# Altium footprint library 2.52-直插元件.PcbLib: 165 footprints (part 7 of 11)
Each footprint in its own frame and in the unit in brackets; x right, y up, seen from the top. Pads: shape width x height; smd on the part's side, far side on the other; paste and mask are expansions set on the pad; w line width, h text height; cw(c..) or ccw(c..) is an arc to the next point about the centre after c.
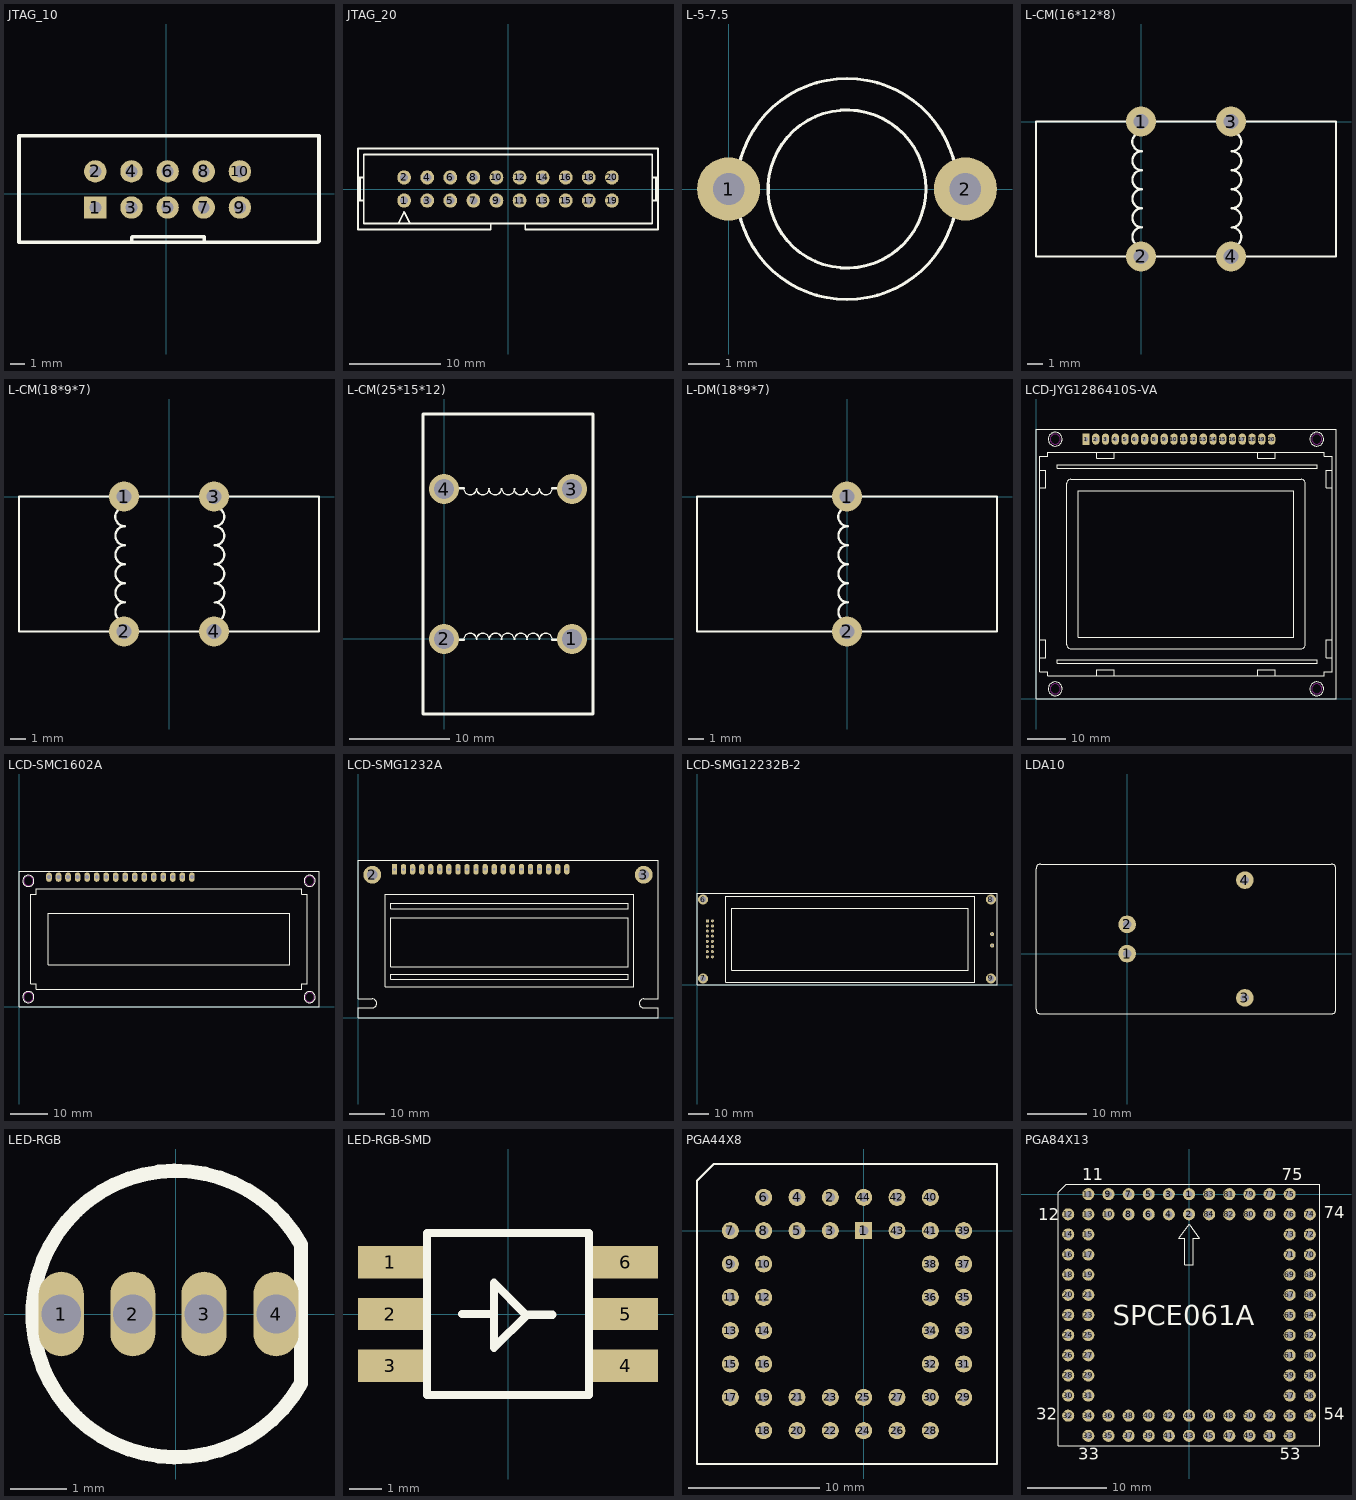
[diagram p6: the footprints below, top view; thin cyan lines are the x and y axes]

## JTAG_10 [mil]
pads (10):
  rect 62x62 hole 33: 1(-195.85,-38.74)
  round 62 hole 33: 2(-195.85,61.26) 3(-95.85,-38.74) 4(-95.85,61.26) 5(4.15,-38.74) 6(4.15,61.26) 7(104.15,-38.74) 8(104.15,61.26) 9(204.15,-38.74) 10(204.15,61.26)
Top Overlay:
  lines w10: -95,-135 -95,-121 -94,-120 105,-120 105,-135 ; -407,-135 -407,160 423,160 423,-132 420,-135 -407,-135

## JTAG_20 [mm]
pads (20):
  oval 1.5x1.575 hole 0.9: 1(-11.43,-1.27) 2(-11.43,1.27) 3(-8.89,-1.27) 4(-8.89,1.27) 5(-6.35,-1.27) 6(-6.35,1.27) 7(-3.81,-1.27) 8(-3.81,1.27) 9(-1.27,-1.27) 10(-1.27,1.27) 11(1.27,-1.27) 12(1.27,1.27) 13(3.81,-1.27) 14(3.81,1.27) 15(6.35,-1.27) 16(6.35,1.27) 17(8.89,-1.27) 18(8.89,1.27) 19(11.43,-1.27) 20(11.43,1.27)
Top Overlay:
  lines w0.203: -16.51,-1.27 -15.875,-1.27 ; -16.51,1.27 -15.875,1.27 ; -16.298,-1.27 -16.298,1.27 ; -12.065,-3.81 -11.43,-2.54 -10.795,-3.81 ; -8.625,-4.445 -1.905,-4.445 -1.905,-3.81 ; -8.255,-4.445 -16.51,-4.445 -16.51,4.445 16.51,4.445 16.51,-4.445 8.255,-4.445 1.905,-4.445 1.905,-3.81 ; 15.875,-1.27 16.51,-1.27 ; 15.875,1.27 16.51,1.27 ; 16.298,-1.27 16.298,1.27 ; -1.905,-3.81 -15.875,-3.81 -15.875,3.81 15.875,3.81 15.875,-3.81 1.905,-3.81 ; -1.905,-3.81 1.905,-3.81

## L-5-7.5 [mm] "淘宝ID:黄晶宝石   店铺网址:https://shop463601444.taobao.com"
pads (2):
  round 2 hole 1: 1(0,0) 2(7.5,0)
Top Overlay:
  circle w0.1: c3.75,0 r2.5
  circle w0.1: c3.75,0 r3.5
3D body: height 15, standoff -7.6, extent -1.088,-4.313 8.588,4.685

## L-CM(16*12*8) [mm]
pads (4):
  round 2 hole 1: 1(0,0) 2(0,-9) 3(6,0) 4(6,-9)
Top Overlay:
  lines w0.15: 0.057,-1.982 cw(c0.057,-1.347) 0.057,-0.712 ; 0.059,-7.059 cw(c0.059,-6.424) 0.059,-5.789 cw(c0.059,-5.154) 0.059,-4.519 ; 0.058,-4.52 cw(c0.058,-3.885) 0.058,-3.25 ; 0.058,-3.251 cw(c0.058,-2.616) 0.058,-1.981 ; 0.06,-8.328 cw(c0.06,-7.693) 0.06,-7.058 ; 6.047,-4.523 ccw(c6.047,-3.888) 6.047,-3.253 ccw(c6.047,-2.618) 6.047,-1.983 ; 6.046,-1.984 ccw(c6.046,-1.349) 6.046,-0.714 ; 6.048,-7.061 ccw(c6.048,-6.426) 6.048,-5.791 ; 6.048,-5.792 ccw(c6.048,-5.157) 6.048,-4.522 ; 6.049,-8.33 ccw(c6.049,-7.695) 6.049,-7.06 ; -7,-9 13,-9 13,0 -7,0 -7,-9
3D body: height 16.27, standoff -5.58, extent -5.775,-9.446 11.775,0.446

## L-CM(18*9*7) [mm]
pads (4):
  round 2 hole 1: 1(-3,0) 2(-3,-9) 3(3,0) 4(3,-9)
Top Overlay:
  lines w0.15: -2.942,-4.52 cw(c-2.942,-3.885) -2.942,-3.25 ; -2.942,-3.251 cw(c-2.942,-2.616) -2.942,-1.981 ; -2.943,-1.982 cw(c-2.943,-1.347) -2.943,-0.712 ; -2.941,-7.059 cw(c-2.941,-6.424) -2.941,-5.789 cw(c-2.941,-5.154) -2.941,-4.519 ; -2.94,-8.328 cw(c-2.94,-7.693) -2.94,-7.058 ; 3.046,-1.984 ccw(c3.046,-1.349) 3.046,-0.714 ; 3.047,-4.523 ccw(c3.047,-3.888) 3.047,-3.253 ccw(c3.047,-2.618) 3.047,-1.983 ; 3.048,-7.061 ccw(c3.048,-6.426) 3.048,-5.791 ; 3.048,-5.792 ccw(c3.048,-5.157) 3.048,-4.522 ; 3.049,-8.33 ccw(c3.049,-7.695) 3.049,-7.06 ; -10,-9 -10,0 10,0 10,-9 -10,-9
3D body: height 16.27, standoff -5.58, extent -8.775,-9.446 8.775,0.446

## L-CM(25*15*12) [mm]
pads (4):
  round 3 hole 2: 1(12.8,0) 2(0,0) 3(12.8,15) 4(0,15)
Top Overlay:
  lines w0.15: 1.981,-0.058 cw(c2.616,-0.058) 3.251,-0.058 ; 1.981,15.058 ccw(c2.616,15.058) 3.251,15.058 ; 3.25,-0.058 cw(c3.885,-0.058) 4.52,-0.058 ; 3.25,15.058 ccw(c3.885,15.058) 4.52,15.058 ; 4.472,15.06 ccw(c5.107,15.06) 5.742,15.06 ; 4.519,-0.059 cw(c5.154,-0.059) 5.789,-0.059 ; 5.741,-0.059 cw(c6.376,-0.059) 7.011,-0.059 ; 5.789,15.059 ccw(c6.424,15.059) 7.059,15.059 ; 7.011,15.059 ccw(c7.646,15.059) 8.281,15.059 ccw(c8.915,15.058) 9.55,15.058 ; 7.058,-0.06 cw(c7.693,-0.06) 8.328,-0.06 ; 8.28,-0.058 cw(c8.915,-0.058) 9.55,-0.058 ; 9.549,-0.058 cw(c10.184,-0.058) 10.819,-0.058 ; 9.549,15.058 ccw(c10.184,15.058) 10.819,15.058
  lines w0.254: 0.058,-0.058 1.981,-0.058 ; 0.058,15.058 1.981,15.058 ; 10.819,-0.058 12.742,-0.058 ; 10.819,15.058 12.742,15.058 ; -2.1,-7.5 -2.1,22.5 14.9,22.5 14.9,-7.5 -2.1,-7.5
3D body: height 27, standoff -5, extent -2.1,-7.002 14.9,22.002

## L-DM(18*9*7) [mm]
pads (2):
  round 2 hole 1: 1(0,0) 2(0,-9)
Top Overlay:
  lines w0.15: 0.057,-1.982 cw(c0.057,-1.347) 0.057,-0.712 ; 0.059,-7.059 cw(c0.059,-6.424) 0.059,-5.789 cw(c0.059,-5.154) 0.059,-4.519 ; 0.058,-4.52 cw(c0.058,-3.885) 0.058,-3.25 ; 0.058,-3.251 cw(c0.058,-2.616) 0.058,-1.981 ; 0.06,-8.328 cw(c0.06,-7.693) 0.06,-7.058 ; -10,-9 10,-9 10,0 -10,0 -10,-9
3D body: height 16.27, standoff -5.58, extent -8.775,-9.446 8.775,0.446

## LCD-JYG1286410S-VA [mm]
pads (20):
  rect 1.905x2.921 hole 1.1: 1(13,67.46)
  oval 1.905x2.921 hole 1.1: 2(15.54,67.46) 3(18.08,67.46) 4(20.62,67.46) 5(23.16,67.46) 6(25.7,67.46) 7(28.24,67.46) 8(30.78,67.46) 9(33.32,67.46) 10(35.86,67.46) 11(38.4,67.46) 12(40.94,67.46) 13(43.48,67.46) 14(46.02,67.46) 15(48.56,67.46) 16(51.1,67.46) 17(53.64,67.46) 18(56.18,67.46) 19(58.72,67.46) 20(61.26,67.46)
Top Overlay:
  circle w0.15: c5,67.46 r1.8
  circle w0.15: c5,2.54 r1.8
  circle w0.15: c73,67.46 r1.8
  circle w0.15: c73,2.54 r1.8
  lines w0.15: 1,10.668 2.516,10.668 2.516,15.24 1,15.24 ; 1.016,54.864 2.532,54.864 2.532,59.436 1.016,59.436 ; 15.748,6 15.748,7.516 20.32,7.516 20.32,6 ; 15.748,64 15.748,62.484 20.32,62.484 20.32,64 ; 57.68,6 57.68,7.516 62.252,7.516 62.252,6 ; 57.68,64 57.68,62.484 62.252,62.484 62.252,64 ; 76.984,54.864 75.468,54.864 75.468,59.436 76.984,59.436 ; 77,10.668 75.484,10.668 75.484,15.24 77,15.24 ; 0,0 78,0 78,70 0,70 0,0 ; 1,7 3,7 3,6 75,6 75,7 77,7 77,63 75,63 75,64 3,64 3,63 1,63 1,7 ; 5.588,9.144 5.588,10.16 73.152,10.16 73.152,9.144 5.588,9.144 ; 5.588,59.84 5.588,60.856 73.152,60.856 73.152,59.84 5.588,59.84 ; 8,14 ccw(c9,14) 9,13 69,13 ccw(c69,14) 70,14 70,56 ccw(c69,56) 69,57 9,57 ccw(c9,56) 8,56 8,14 ; 11,16 11,54 67,54 67,16 11,16
Keep-Out Layer:
  circle w0.15: c5,2.54 r1.3
  circle w0.15: c5,67.46 r1.3
  circle w0.15: c73,67.46 r1.3
  circle w0.15: c73,2.54 r1.3
3D body: height 7, standoff -8.4, extent 0,0 78,70

## LCD-SMC1602A [mm]
pads (16):
  oval 1.5x2.5 hole 1: 1(8.001,34.5) 2(10.541,34.5) 3(13.081,34.5) 4(15.621,34.5) 5(18.161,34.5) 6(20.701,34.5) 7(23.241,34.5) 8(25.781,34.5) 9(28.321,34.5) 10(30.861,34.5) 11(33.401,34.5) 12(35.941,34.5) 13(38.481,34.5) 14(41.021,34.5) 15(43.561,34.5) 16(46.101,34.5)
Top Overlay:
  circle w0.15: c77.5,33.5 r1.5
  circle w0.15: c77.5,2.5 r1.5
  circle w0.15: c2.5,33.5 r1.5
  circle w0.15: c2.5,2.5 r1.5
  lines w0.15: 0,0 0,36 80,36 80,0 0,0 ; 3.15,6.1 4.65,6.1 4.65,4.6 75.35,4.6 75.35,6.1 76.85,6.1 76.85,29.9 75.35,29.9 75.35,31.4 4.65,31.4 4.65,29.9 3.15,29.9 3.15,6.1 ; 7.75,11.1 7.75,24.9 72.25,24.9 72.25,11.1 7.75,11.1
Keep-Out Layer:
  circle w0.15: c77.5,33.5 r1.25
  circle w0.15: c77.5,2.5 r1.25
  circle w0.15: c2.5,33.5 r1.25
  circle w0.15: c2.5,2.5 r1.25
3D body: height 6.17, standoff -9.17, extent 0,0 80,36

## LCD-SMG1232A [mm]
pads (22):
  rect 1.5x3 hole 0.8: 1(10.2,41.5)
  round 5 hole 3: 2(4,40) 3(80,40)
  oval 1.5x3 hole 0.8: 2(12.74,41.5) 3(15.28,41.5) 4(17.82,41.5) 5(20.36,41.5) 6(22.9,41.5) 7(25.44,41.5) 8(27.98,41.5) 9(30.52,41.5) 10(33.06,41.5) 11(35.6,41.54) 12(38.14,41.54) 13(40.68,41.54) 14(43.22,41.54) 15(45.76,41.54) 16(48.3,41.54) 17(50.84,41.54) 18(53.38,41.54) 19(55.92,41.54) 20(58.46,41.54)
Top Overlay:
  lines w0.15: 0,0 84,0 84,2.75 80,2.75 cw(c80,4) 80,5.25 84,5.25 84,44 0,44 0,5.25 4,5.25 cw(c4,4) 4,2.75 0,2.75 0,0 ; 7.62,8.636 7.62,34.544 77.216,34.544 77.216,8.636 7.62,8.636 ; 9.144,10.668 75.692,10.668 75.692,12.192 9.144,12.192 9.144,10.668 ; 9.144,14.224 75.692,14.224 75.692,27.94 9.144,27.94 9.144,14.224 ; 9.144,30.48 75.692,30.48 75.692,32.004 9.144,32.004 9.144,30.48
3D body: height 18, standoff -18, extent 1.721,23.606 81.721,37.506

## LCD-SMG12232B-2 [mm]
pads (22):
  rect 1.5x1.5 hole 0.8: 1(5.08,31.496)
  round 1.5 hole 0.8: 2(7.62,31.496) 3(5.08,28.956) 4(7.62,28.956) 5(5.08,26.416) 6(7.62,26.416) 7(5.08,23.876) 8(7.62,23.876) 9(5.08,21.336) 10(7.62,21.336) 11(5.08,18.796) 12(7.62,18.796) 13(5.08,16.256) 14(7.62,16.256) 15(5.08,13.716) 16(7.62,13.716)
  round 2 hole 1: 4(145.796,24.892) 5(145.796,19.304)
  round 5 hole 3: 6(3,42) 7(3,3) 8(145.2,42) 9(145.2,3)
Top Overlay:
  lines w0.15: 0,0 0,45 148.2,45 148.2,0 0,0 ; 14.224,1.016 14.224,43.688 137.16,43.688 137.16,1.016 14.224,1.016 ; 17.272,7.112 134.112,7.112 134.112,37.592 17.272,37.592 17.272,7.112
3D body: height 5.03, standoff -4.57, extent 15.536,3.94 131.614,41.278

## LDA10 [mm]
pads (4):
  round 3 hole 1.5: 1(0,0) 2(0,5) 3(20,-7.5) 4(20,12.5)
Top Overlay:
  lines w0.1: -15.5,-9.453 ccw(c-14.703,-9.453) -14.703,-10.25 34.703,-10.25 ccw(c34.703,-9.453) 35.5,-9.453 35.5,14.453 ccw(c34.703,14.453) 34.703,15.25 -14.703,15.25 ccw(c-14.703,14.453) -15.5,14.453 -15.5,-9.453

## LED-RGB [mm] "三基色二极管"
height 6
pads (4):
  oval 0.8x1.5 hole 0.7: 1(-2.032,0) 2(-0.762,0) 3(0.5,0) 4(1.778,0)
Top Overlay:
  lines w0.254: 2.22,-1.234 cw(c0,0) 2.22,1.234 2.22,-1.234

## LED-RGB-SMD [mm]
pads (6):
  rect 2x1 smd: 1(-3.632,1.6) 2(-3.632,0) 3(-3.632,-1.6) 4(3.632,-1.6) 5(3.632,0) 6(3.632,1.6)
Top Overlay:
  lines w0.254: -1.422,0 -0.432,0 ; 1.372,-0.025 0.584,-0.025 ; 0.584,-0.025 -0.432,-1.041 -0.432,0.965 0.559,-0.025 0.584,-0.025 ; -2.5,-2.5 2.5,-2.5 2.5,2.5 -2.5,2.5 -2.5,-2.5

## PGA44X8 [mm]
pads (44):
  rect 1.3x1.3 hole 0.7: 1(0,0)
  round 1.3 hole 0.7: 2(-2.54,2.54) 3(-2.54,0) 4(-5.08,2.54) 5(-5.08,0) 6(-7.62,2.54) 7(-10.16,0) 8(-7.62,0) 9(-10.16,-2.54) 10(-7.62,-2.54) 11(-10.16,-5.08) 12(-7.62,-5.08) 13(-10.16,-7.62) 14(-7.62,-7.62) 15(-10.16,-10.16) 16(-7.62,-10.16) 17(-10.16,-12.7) 18(-7.62,-15.24) 19(-7.62,-12.7) 20(-5.08,-15.24) 21(-5.08,-12.7) 22(-2.54,-15.24) 23(-2.54,-12.7) 24(0,-15.24) 25(0,-12.7) 26(2.54,-15.24) 27(2.54,-12.7) 28(5.08,-15.24) 29(7.62,-12.7) 30(5.08,-12.7) 31(7.62,-10.16) 32(5.08,-10.16) 33(7.62,-7.62) 34(5.08,-7.62) 35(7.62,-5.08) 36(5.08,-5.08) 37(7.62,-2.54) 38(5.08,-2.54) 39(7.62,0) 40(5.08,2.54) 41(5.08,0) 42(2.54,2.54) 43(2.54,0) 44(0,2.54)
Top Overlay:
  lines w0.15: -12.7,-17.78 -12.7,3.81 -11.43,5.08 10.16,5.08 10.16,-17.78 -12.7,-17.78
3D body: height 8.16, standoff -3.3, extent -12.495,-17.575 9.955,4.875

## PGA84X13 [mil]
pads (84):
  round 60 hole 34: 1(0,0) 2(0,-100) 3(-100,0) 4(-100,-100) 5(-200,0) 6(-200,-100) 7(-300,0) 8(-300,-100) 9(-400,0) 10(-400,-100) 11(-500,0) 12(-600,-100) 13(-500,-100) 14(-600,-200) 15(-500,-200) 16(-600,-300) 17(-500,-300) 18(-600,-400) 19(-500,-400) 20(-600,-500) 21(-500,-500) 22(-600,-600) 23(-500,-600) 24(-600,-700) 25(-500,-700) 26(-600,-800) 27(-500,-800) 28(-600,-900) 29(-500,-900) 30(-600,-1000) 31(-500,-1000) 32(-600,-1100) 33(-500,-1200) 34(-500,-1100) 35(-400,-1200) 36(-400,-1100) 37(-300,-1200) 38(-300,-1100) 39(-200,-1200) 40(-200,-1100) 41(-100,-1200) 42(-100,-1100) 43(0,-1200) 44(0,-1100) 45(100,-1200) 46(100,-1100) 47(200,-1200) 48(200,-1100) 49(300,-1200) 50(300,-1100) 51(400,-1200) 52(400,-1100) 53(500,-1200) 54(600,-1100) 55(500,-1100) 56(600,-1000) 57(500,-1000) 58(600,-900) 59(500,-900) 60(600,-800) 61(500,-800) 62(600,-700) 63(500,-700) 64(600,-600) 65(500,-600) 66(600,-500) 67(500,-500) 68(600,-400) 69(500,-400) 70(600,-300) 71(500,-300) 72(600,-200) 73(500,-200) 74(600,-100) 75(500,0) 76(500,-100) 77(400,0) 78(400,-100) 79(300,0) 80(300,-100) 81(200,0) 82(200,-100) 83(100,0) 84(100,-100)
Top Overlay:
  lines w5.91: -650,-1250 650,-1250 650,50 -610,50 -650,10 -650,-1250 ; -50,-220 0,-150 50,-220 20,-220 20,-350 -20,-350 -20,-220 -50,-220
  text "SPCE061A" at -380,-650 h100
  text "53" at 450,-1320 h60
  text "33" at -550,-1320 h60
  text "75" at 460,70 h60
  text "11" at -530,70 h60
  text "32" at -760,-1120 h60
  text "12" at -750,-130 h60
  text "54" at 670,-1120 h60
  text "74" at 670,-120 h60
3D body: height 317.32, standoff -188.19, extent -691.93,-1291.93 691.93,91.93